# Altium integrated library AltiumLib.IntLib: 5 symbols
Pins are listed as number, name and electrical type; pins without a type are passive.

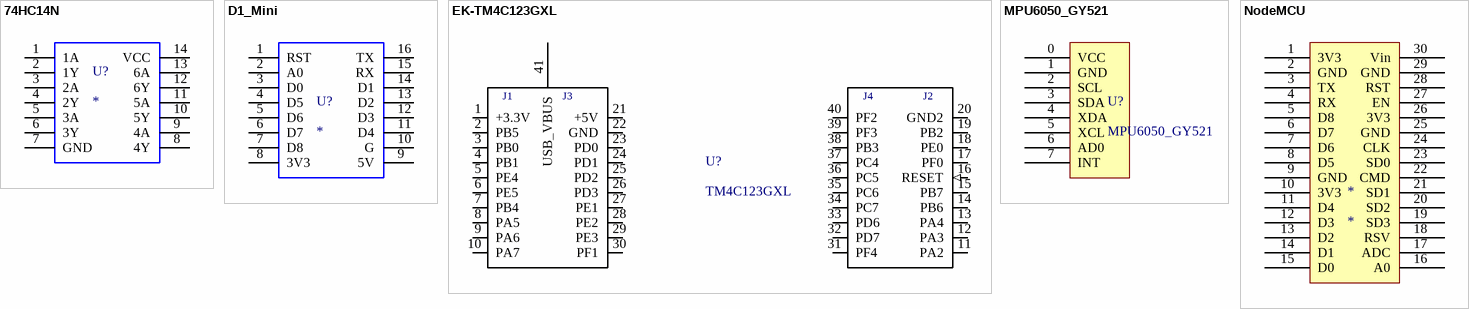
[diagram p0: symbols 74HC14N to NodeMCU]

## 74HC14N
designator U?
footprint 74HC14N
pins: 1 1A, 2 1Y, 3 2A, 4 2Y, 5 3A, 6 3Y, 7 GND, 8 4Y, 9 4A, 10 5Y, 11 5A, 12 6Y, 13 6A, 14 VCC

## D1_Mini
designator U?
footprint D1_Mini
pins: 1 RST, 2 A0, 3 D0, 4 D5, 5 D6, 6 D7, 7 D8, 8 3V3, 9 5V, 10 G, 11 D4, 12 D3, 13 D2, 14 D1, 15 RX, 16 TX

## EK-TM4C123GXL
designator U?, comment TM4C123GXL
footprint EK-TM4C123GXL
pins: 1 +3.3V (power), 2 PB5 (io), 3 PB0 (io), 4 PB1 (io), 5 PE4 (io), 6 PE5 (io), 7 PB4 (io), 8 PA5 (io), 9 PA6 (io), 10 PA7 (io), 11 PA2 (io), 12 PA3 (io), 13 PA4 (io), 14 PB6 (io), 15 PB7 (io), 16 RESET (in), 17 PF0 (io), 18 PE0 (io), 19 PB2 (io), 20 GND2 (power), 21 +5V (power), 22 GND (power), 23 PD0 (io), 24 PD1 (io), 25 PD2 (io), 26 PD3 (io), 27 PE1 (io), 28 PE2 (io), 29 PE3 (io), 30 PF1 (io), 31 PF4 (io), 32 PD7 (io), 33 PD6 (io), 34 PC7 (io), 35 PC6 (io), 36 PC5 (io), 37 PC4 (io), 38 PB3 (io), 39 PF3 (io), 40 PF2 (io), 41 USB_VBUS
text: J1; J3; J4; J2

## MPU6050_GY521
designator U?
footprint GT-521
footprint MPU6050_GY521
pins: 0 VCC (power), 1 GND (power), 2 SCL, 3 SDA, 4 XDA, 5 XCL, 6 AD0, 7 INT

## NodeMCU
designator *
footprint NODEMCU_DEVKIT_V1.0
pins: 1 3V3, 2 GND, 3 TX, 4 RX, 5 D8, 6 D7, 7 D6, 8 D5, 9 GND, 10 3V3, 11 D4, 12 D3, 13 D2, 14 D1, 15 D0, 16 A0, 17 ADC, 18 RSV, 19 SD3, 20 SD2, 21 SD1, 22 CMD, 23 SD0, 24 CLK, 25 GND, 26 3V3, 27 EN, 28 RST, 29 GND, 30 Vin